# Altium footprint library Dip Switches.PcbLib: 39 footprints (part 3 of 3)
Each footprint in its own frame and in the unit in brackets; x right, y up, seen from the top. Pads: shape width x height; smd on the part's side, far side on the other; paste and mask are expansions set on the pad; w line width, h text height; cw(c..) or ccw(c..) is an arc to the next point about the centre after c.
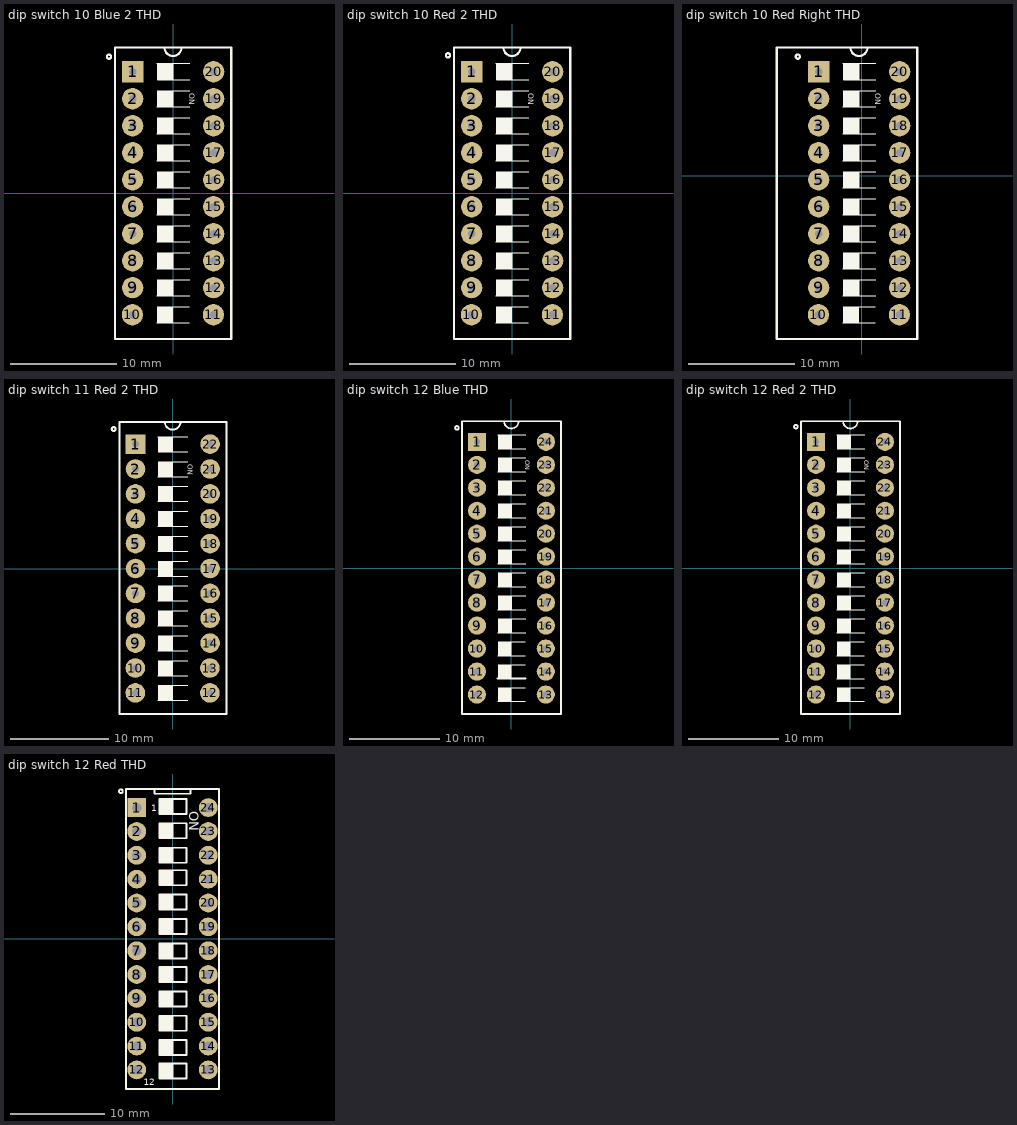
[diagram p2: the footprints below, top view; thin cyan lines are the x and y axes]

## dip switch 10 Blue 2 THD [mm]
height 6.5
pads (20):
  rect 2x2 hole 0.7: 1(-3.799,11.432)
  round 2 hole 0.7: 2(-3.799,8.892) 3(-3.799,6.352) 4(-3.799,3.812) 5(-3.799,1.272) 6(-3.799,-1.268) 7(-3.799,-3.808) 8(-3.799,-6.348) 9(-3.799,-8.888) 10(-3.821,-11.432) 11(3.799,-11.432) 12(3.821,-8.888) 13(3.821,-6.348) 14(3.821,-3.808) 15(3.821,-1.268) 16(3.821,1.272) 17(3.821,3.812) 18(3.821,6.352) 19(3.821,8.892) 20(3.821,11.432)
Top Overlay:
  circle w0.2: c-6.03,12.85 r0.2
  rectangle: -1.489,10.656 0.036,12.212
  rectangle: -1.489,8.106 0.036,9.662
  rectangle: -1.489,5.566 0.036,7.122
  rectangle: -1.489,3.026 0.036,4.582
  rectangle: -1.489,0.486 0.036,2.042
  rectangle: -1.489,-2.054 0.036,-0.498
  rectangle: -1.489,-4.594 0.036,-3.038
  rectangle: -1.489,-7.134 0.036,-5.578
  rectangle: -1.489,-9.674 0.036,-8.118
  rectangle: -1.511,-12.218 0.014,-10.662
  lines w0.1: -1.535,-12.202 1.539,-12.202 ; -1.513,-9.658 1.561,-9.658 ; -1.513,-7.118 1.561,-7.118 ; -1.513,-4.578 1.561,-4.578 ; -1.513,-2.038 1.561,-2.038 ; -1.513,0.502 1.561,0.502 ; -1.513,3.042 1.561,3.042 ; -1.513,5.582 1.561,5.582 ; -1.513,8.122 1.561,8.122 ; -1.513,12.212 1.561,12.212 ; -1.481,-10.672 1.539,-10.672 ; -1.459,-8.128 1.561,-8.128 ; -1.459,-5.588 1.561,-5.588 ; -1.459,-3.048 1.561,-3.048 ; -1.459,-0.508 1.561,-0.508 ; -1.459,2.032 1.561,2.032 ; -1.459,4.572 1.561,4.572 ; -1.459,7.112 1.561,7.112 ; -1.459,9.652 1.561,9.652 ; -1.459,10.672 1.561,10.672
  lines w0.2: -0.807,13.712 ccw(c-0.007,13.712) 0.793,13.712 ; -5.45,-13.714 -5.45,13.712 5.472,13.712 5.472,-13.714 -5.45,-13.714
  text "ON" at 1.535,9.4 h0.51
3D body "User Library-DIP SWITCH 10 POS CTS 206.step": height 8.25, standoff -3.5, extent -4.878,-13.861 4.902,13.719

## dip switch 10 Red 2 THD [mm]
height 6.5
pads (20):
  rect 2x2 hole 0.7: 1(-3.799,11.432)
  round 2 hole 0.7: 2(-3.799,8.892) 3(-3.799,6.352) 4(-3.799,3.812) 5(-3.799,1.272) 6(-3.799,-1.268) 7(-3.799,-3.808) 8(-3.799,-6.348) 9(-3.799,-8.888) 10(-3.821,-11.432) 11(3.799,-11.432) 12(3.821,-8.888) 13(3.821,-6.348) 14(3.821,-3.808) 15(3.821,-1.268) 16(3.821,1.272) 17(3.821,3.812) 18(3.821,6.352) 19(3.821,8.892) 20(3.821,11.432)
Top Overlay:
  circle w0.2: c-6.03,12.977 r0.2
  rectangle: -1.511,-12.218 0.014,-10.662
  rectangle: -1.489,-9.674 0.036,-8.118
  rectangle: -1.489,-7.134 0.036,-5.578
  rectangle: -1.489,-4.594 0.036,-3.038
  rectangle: -1.489,-2.054 0.036,-0.498
  rectangle: -1.489,0.486 0.036,2.042
  rectangle: -1.489,3.026 0.036,4.582
  rectangle: -1.489,5.566 0.036,7.122
  rectangle: -1.489,8.106 0.036,9.662
  rectangle: -1.489,10.656 0.036,12.212
  lines w0.1: -1.535,-12.202 1.539,-12.202 ; -1.513,-9.658 1.561,-9.658 ; -1.513,-7.118 1.561,-7.118 ; -1.513,-4.578 1.561,-4.578 ; -1.513,-2.038 1.561,-2.038 ; -1.513,0.502 1.561,0.502 ; -1.513,3.042 1.561,3.042 ; -1.513,5.582 1.561,5.582 ; -1.513,8.122 1.561,8.122 ; -1.513,12.212 1.561,12.212 ; -1.481,-10.672 1.539,-10.672 ; -1.459,-8.128 1.561,-8.128 ; -1.459,-5.588 1.561,-5.588 ; -1.459,-3.048 1.561,-3.048 ; -1.459,-0.508 1.561,-0.508 ; -1.459,2.032 1.561,2.032 ; -1.459,4.572 1.561,4.572 ; -1.459,7.112 1.561,7.112 ; -1.459,9.652 1.561,9.652 ; -1.459,10.672 1.561,10.672
  lines w0.2: -0.807,13.712 ccw(c-0.007,13.712) 0.793,13.712 ; -5.45,-13.714 5.472,-13.714 5.472,13.712 -5.45,13.712 -5.45,-13.714
  text "ON" at 1.535,9.4 h0.51
3D body "User Library-DS1040-10 (DIP_switch).step": height 6.8, standoff -3.85, extent -4.975,-13.441 4.925,13.419

## dip switch 10 Red Right THD [mm]
height 6.5
pads (20):
  rect 2x2 hole 0.7: 1(-4.053,9.781)
  round 2 hole 0.7: 2(-4.053,7.241) 3(-4.053,4.701) 4(-4.053,2.161) 5(-4.053,-0.379) 6(-4.053,-2.919) 7(-4.053,-5.459) 8(-4.053,-7.999) 9(-4.053,-10.539) 10(-4.075,-13.083) 11(3.545,-13.083) 12(3.567,-10.539) 13(3.567,-7.999) 14(3.567,-5.459) 15(3.567,-2.919) 16(3.567,-0.379) 17(3.567,2.161) 18(3.567,4.701) 19(3.567,7.241) 20(3.567,9.781)
Top Overlay:
  circle w0.2: c-6.02,11.201 r0.2
  rectangle: -1.743,-3.705 -0.218,-2.149
  rectangle: -1.743,-6.245 -0.218,-4.689
  rectangle: -1.743,9.005 -0.218,10.561
  rectangle: -1.743,6.455 -0.218,8.011
  rectangle: -1.743,3.915 -0.218,5.471
  rectangle: -1.743,1.375 -0.218,2.931
  rectangle: -1.743,-1.165 -0.218,0.391
  rectangle: -1.743,-8.785 -0.218,-7.229
  rectangle: -1.743,-11.325 -0.218,-9.769
  rectangle: -1.765,-13.869 -0.24,-12.313
  lines w0.1: -1.789,-13.853 1.285,-13.853 ; -1.767,-11.309 1.307,-11.309 ; -1.767,-8.769 1.307,-8.769 ; -1.767,-6.229 1.307,-6.229 ; -1.767,-3.689 1.307,-3.689 ; -1.767,-1.149 1.307,-1.149 ; -1.767,1.391 1.307,1.391 ; -1.767,3.931 1.307,3.931 ; -1.767,6.471 1.307,6.471 ; -1.767,10.561 1.307,10.561 ; -1.735,-12.323 1.285,-12.323 ; -1.713,-9.779 1.307,-9.779 ; -1.713,-7.239 1.307,-7.239 ; -1.713,-4.699 1.307,-4.699 ; -1.713,-2.159 1.307,-2.159 ; -1.713,0.381 1.307,0.381 ; -1.713,2.921 1.307,2.921 ; -1.713,5.461 1.307,5.461 ; -1.713,8.001 1.307,8.001 ; -1.713,9.021 1.307,9.021
  lines w0.2: -1.061,12.061 ccw(c-0.261,12.061) 0.539,12.061 ; -7.99,-15.365 -7.99,12.061 5.218,12.061 5.218,-15.365 -7.99,-15.365
  text "ON" at 1.281,7.749 h0.51
3D body "User Library-DIP-Switch-10P (1).step": height 9.5, standoff -3.5, extent -7.799,-15.129 4.701,11.831

## dip switch 11 Red 2 THD [mm]
height 6.5
pads (22):
  rect 2x2 hole 0.7: 1(-3.799,12.702)
  round 2 hole 0.7: 2(-3.799,10.162) 3(-3.799,7.622) 4(-3.799,5.082) 5(-3.799,2.542) 6(-3.799,0.002) 7(-3.799,-2.538) 8(-3.799,-5.078) 9(-3.799,-7.618) 10(-3.821,-10.162) 11(-3.821,-12.702) 12(3.799,-12.702) 13(3.799,-10.162) 14(3.821,-7.618) 15(3.821,-5.078) 16(3.821,-2.538) 17(3.821,0.002) 18(3.821,2.542) 19(3.821,5.082) 20(3.821,7.622) 21(3.821,10.162) 22(3.821,12.702)
Top Overlay:
  circle w0.2: c-6.03,14.247 r0.2
  rectangle: -1.511,-13.488 0.014,-11.932
  rectangle: -1.489,-0.784 0.036,0.772
  rectangle: -1.489,-3.324 0.036,-1.768
  rectangle: -1.489,11.926 0.036,13.482
  rectangle: -1.489,9.376 0.036,10.932
  rectangle: -1.489,6.836 0.036,8.392
  rectangle: -1.489,4.296 0.036,5.852
  rectangle: -1.489,1.756 0.036,3.312
  rectangle: -1.489,-5.864 0.036,-4.308
  rectangle: -1.489,-8.404 0.036,-6.848
  rectangle: -1.511,-10.948 0.014,-9.392
  lines w0.1: -1.535,-13.472 1.539,-13.472 ; -1.535,-10.932 1.539,-10.932 ; -1.513,-8.388 1.561,-8.388 ; -1.513,-5.848 1.561,-5.848 ; -1.513,-3.308 1.561,-3.308 ; -1.513,-0.768 1.561,-0.768 ; -1.513,1.772 1.561,1.772 ; -1.513,4.312 1.561,4.312 ; -1.513,6.852 1.561,6.852 ; -1.513,9.392 1.561,9.392 ; -1.513,13.482 1.561,13.482 ; -1.481,-11.942 1.539,-11.942 ; -1.481,-9.402 1.539,-9.402 ; -1.459,-6.858 1.561,-6.858 ; -1.459,-4.318 1.561,-4.318 ; -1.459,-1.778 1.561,-1.778 ; -1.459,0.762 1.561,0.762 ; -1.459,3.302 1.561,3.302 ; -1.459,5.842 1.561,5.842 ; -1.459,8.382 1.561,8.382 ; -1.459,10.922 1.561,10.922 ; -1.459,11.942 1.561,11.942
  lines w0.2: -0.807,14.982 ccw(c-0.007,14.982) 0.793,14.982 ; -5.45,-14.857 -5.45,14.982 5.472,14.982 5.472,-14.857 -5.45,-14.857
  text "ON" at 1.535,10.67 h0.51
3D body "User Library-DS1040-11 (DIP_switch).step": height 6.8, standoff -3.85, extent -4.937,-14.698 4.963,14.702

## dip switch 12 Blue THD [mm]
height 6.5
pads (24):
  rect 2x2 hole 0.7: 1(-3.799,13.972)
  round 2 hole 0.7: 2(-3.799,11.432) 3(-3.799,8.892) 4(-3.799,6.352) 5(-3.799,3.812) 6(-3.799,1.272) 7(-3.799,-1.268) 8(-3.799,-3.808) 9(-3.799,-6.348) 10(-3.821,-8.892) 11(-3.821,-11.432) 12(-3.821,-13.972) 13(3.799,-13.972) 14(3.799,-11.432) 15(3.799,-8.892) 16(3.821,-6.348) 17(3.821,-3.808) 18(3.821,-1.268) 19(3.821,1.272) 20(3.821,3.812) 21(3.821,6.352) 22(3.821,8.892) 23(3.821,11.432) 24(3.821,13.972)
Top Overlay:
  circle w0.2: c-6.03,15.517 r0.2
  rectangle: -1.511,-14.758 0.014,-13.202
  rectangle: -1.511,-9.678 0.014,-8.122
  rectangle: -1.489,-7.134 0.036,-5.578
  rectangle: -1.489,-4.594 0.036,-3.038
  rectangle: -1.489,3.026 0.036,4.582
  rectangle: -1.489,5.566 0.036,7.122
  rectangle: -1.489,8.106 0.036,9.662
  rectangle: -1.489,10.646 0.036,12.202
  rectangle: -1.489,13.196 0.036,14.752
  rectangle: -1.489,-2.054 0.036,-0.498
  rectangle: -1.489,0.486 0.036,2.042
  rectangle: -1.511,-12.218 0.014,-10.662
  lines w0.1: -1.535,-14.742 1.539,-14.742 ; -1.535,-9.662 1.539,-9.662 ; -1.513,-7.118 1.561,-7.118 ; -1.513,-4.578 1.561,-4.578 ; -1.513,-2.038 1.561,-2.038 ; -1.513,0.502 1.561,0.502 ; -1.513,3.042 1.561,3.042 ; -1.513,5.582 1.561,5.582 ; -1.513,8.122 1.561,8.122 ; -1.513,10.662 1.561,10.662 ; -1.513,14.752 1.561,14.752 ; -1.481,-13.212 1.539,-13.212 ; -1.481,-10.672 1.539,-10.672 ; -1.481,-8.132 1.539,-8.132 ; -1.459,-5.588 1.561,-5.588 ; -1.459,-3.048 1.561,-3.048 ; -1.459,-0.508 1.561,-0.508 ; -1.459,2.032 1.561,2.032 ; -1.459,4.572 1.561,4.572 ; -1.459,7.112 1.561,7.112 ; -1.459,9.652 1.561,9.652 ; -1.459,12.192 1.561,12.192 ; -1.459,13.212 1.561,13.212
  lines w0.2: -0.807,16.252 ccw(c-0.007,16.252) 0.793,16.252 ; -5.45,-16.127 5.472,-16.127 5.472,16.252 -5.45,16.252 -5.45,-16.127
  lines w0.25: -1.535,-12.202 1.539,-12.202
  text "ON" at 1.535,11.94 h0.51
3D body "User Library-DIP SWITCH 12 POS CTS 206.step": height 8.25, standoff -3.5, extent -4.625,-16.328 5.155,16.332

## dip switch 12 Red 2 THD [mm]
height 6.5
pads (24):
  rect 2x2 hole 0.7: 1(-3.799,13.972)
  round 2 hole 0.7: 2(-3.799,11.432) 3(-3.799,8.892) 4(-3.799,6.352) 5(-3.799,3.812) 6(-3.799,1.272) 7(-3.799,-1.268) 8(-3.799,-3.808) 9(-3.799,-6.348) 10(-3.821,-8.892) 11(-3.821,-11.432) 12(-3.821,-13.972) 13(3.799,-13.972) 14(3.799,-11.432) 15(3.799,-8.892) 16(3.821,-6.348) 17(3.821,-3.808) 18(3.821,-1.268) 19(3.821,1.272) 20(3.821,3.812) 21(3.821,6.352) 22(3.821,8.892) 23(3.821,11.432) 24(3.821,13.972)
Top Overlay:
  circle w0.2: c-6.03,15.644 r0.2
  rectangle: -1.511,-12.218 0.014,-10.662
  rectangle: -1.489,0.486 0.036,2.042
  rectangle: -1.489,-2.054 0.036,-0.498
  rectangle: -1.489,13.196 0.036,14.752
  rectangle: -1.489,10.646 0.036,12.202
  rectangle: -1.489,8.106 0.036,9.662
  rectangle: -1.489,5.566 0.036,7.122
  rectangle: -1.489,3.026 0.036,4.582
  rectangle: -1.489,-4.594 0.036,-3.038
  rectangle: -1.489,-7.134 0.036,-5.578
  rectangle: -1.511,-9.678 0.014,-8.122
  rectangle: -1.511,-14.758 0.014,-13.202
  lines w0.1: -1.535,-14.742 1.539,-14.742 ; -1.535,-12.202 1.539,-12.202 ; -1.535,-9.662 1.539,-9.662 ; -1.513,-7.118 1.561,-7.118 ; -1.513,-4.578 1.561,-4.578 ; -1.513,-2.038 1.561,-2.038 ; -1.513,0.502 1.561,0.502 ; -1.513,3.042 1.561,3.042 ; -1.513,5.582 1.561,5.582 ; -1.513,8.122 1.561,8.122 ; -1.513,10.662 1.561,10.662 ; -1.513,14.752 1.561,14.752 ; -1.481,-13.212 1.539,-13.212 ; -1.481,-10.672 1.539,-10.672 ; -1.481,-8.132 1.539,-8.132 ; -1.459,-5.588 1.561,-5.588 ; -1.459,-3.048 1.561,-3.048 ; -1.459,-0.508 1.561,-0.508 ; -1.459,2.032 1.561,2.032 ; -1.459,4.572 1.561,4.572 ; -1.459,7.112 1.561,7.112 ; -1.459,9.652 1.561,9.652 ; -1.459,12.192 1.561,12.192 ; -1.459,13.212 1.561,13.212
  lines w0.2: -0.807,16.252 ccw(c-0.007,16.252) 0.793,16.252 ; -5.45,-16.127 -5.45,16.252 5.472,16.252 5.472,-16.127 -5.45,-16.127
  text "ON" at 1.535,11.94 h0.51
3D body "User Library-DS1040-12 (DIP_switch).step": height 6.8, standoff -3.85, extent -4.939,-15.968 4.961,15.972

## dip switch 12 Red THD [mm] "SWITCH DIP 12POS, THD, 2.54mm"
pads (24):
  rect 2x2 hole 1: 1(-3.81,13.97)
  round 2 hole 1: 2(-3.81,11.43) 3(-3.81,8.89) 4(-3.81,6.35) 5(-3.81,3.81) 6(-3.81,1.27) 7(-3.81,-1.27) 8(-3.81,-3.81) 9(-3.81,-6.35) 10(-3.81,-8.89) 11(-3.81,-11.43) 12(-3.81,-13.97) 13(3.81,-13.97) 14(3.81,-11.43) 15(3.81,-8.89) 16(3.81,-6.35) 17(3.81,-3.81) 18(3.81,-1.27) 19(3.81,1.27) 20(3.81,3.81) 21(3.81,6.35) 22(3.81,8.89) 23(3.81,11.43) 24(3.81,13.97)
Top Overlay:
  circle w0.2: c-5.5,15.71 r0.2
  rectangle: -1.4,13.3 0.1,14.9
  rectangle: -1.4,10.7 0.1,12.3
  rectangle: -1.4,8.1 0.1,9.7
  rectangle: -1.4,5.7 0.1,7.3
  rectangle: -1.4,3.1 0.1,4.7
  rectangle: -1.4,0.5 0.1,2.1
  rectangle: -1.4,-2.1 0.1,-0.5
  rectangle: -1.4,-4.6 0.1,-3
  rectangle: -1.4,-14.9 0.1,-13.3
  rectangle: -1.4,-12.4 0.1,-10.8
  rectangle: -1.4,-9.8 0.1,-8.2
  rectangle: -1.4,-7.2 0.1,-5.6
  lines w0.2: -1.91,15.951 -1.91,15.443 1.9,15.443 1.9,15.951 ; -4.953,-16.002 4.953,-16.002 4.953,15.951 -4.953,15.951 -4.953,-16.002 ; -1.4,-14.9 1.5,-14.9 1.5,-13.3 -1.4,-13.3 -1.4,-14.9 ; -1.4,-12.4 1.5,-12.4 1.5,-10.8 -1.4,-10.8 -1.4,-12.4 ; -1.4,-9.8 1.5,-9.8 1.5,-8.2 -1.4,-8.2 -1.4,-9.8 ; -1.4,-7.2 1.5,-7.2 1.5,-5.6 -1.4,-5.6 -1.4,-7.2 ; -1.4,-4.6 -1.4,-3 1.5,-3 1.5,-4.6 -1.4,-4.6 ; -1.4,-2.1 -1.4,-0.5 1.5,-0.5 1.5,-2.1 -1.4,-2.1 ; -1.4,0.5 -1.4,2.1 1.5,2.1 1.5,0.5 -1.4,0.5 ; -1.4,3.1 -1.4,4.7 1.5,4.7 1.5,3.1 -1.4,3.1 ; -1.4,5.7 -1.4,7.3 1.5,7.3 1.5,5.7 -1.4,5.7 ; -1.4,8.1 -1.4,9.7 1.5,9.7 1.5,8.1 -1.4,8.1 ; -1.4,10.7 -1.4,12.3 1.5,12.3 1.5,10.7 -1.4,10.7 ; -1.4,13.3 -1.4,14.9 1.5,14.9 1.5,13.3 -1.4,13.3
  text "1" at -2.286,13.589 h0.7
  text "12" at -3.048,-15.621 h0.7
  text "ON" at 1.8,13.6 h1
3D body: height 5.59, standoff 0, extent -1.448,-13.208 1.443,-12.192
3D body: height 5.08, standoff 0.25, extent -0.737,-14.732 1.443,-13.208
3D body: height 6.35, standoff 0.25, extent -1.448,-14.732 -0.737,-13.208
3D body: height 5.59, standoff 0, extent -1.448,-10.668 1.443,-9.652
3D body: height 5.08, standoff 0.25, extent -0.737,-12.192 1.443,-10.668
3D body: height 6.35, standoff 0.25, extent -1.448,-12.192 -0.737,-10.668
3D body: height 5.59, standoff 0, extent -1.448,-8.128 1.443,-7.112
3D body: height 5.08, standoff 0.25, extent -0.737,-9.652 1.443,-8.128
3D body: height 6.35, standoff 0.25, extent -1.448,-9.652 -0.737,-8.128
3D body: height 5.59, standoff 0, extent -1.448,-5.588 1.443,-4.572
3D body: height 5.08, standoff 0.25, extent -0.737,-7.112 1.443,-5.588
3D body: height 6.35, standoff 0.25, extent -1.448,-7.112 -0.737,-5.588
3D body: height 5.59, standoff 0, extent -1.448,-3.048 1.443,-2.032
3D body: height 5.08, standoff 0.25, extent -0.737,-4.572 1.443,-3.048
3D body: height 6.35, standoff 0.25, extent -1.448,-4.572 -0.737,-3.048
3D body: height 5.59, standoff 0, extent -1.448,-0.508 1.443,0.508
3D body: height 5.08, standoff 0.25, extent -0.737,-2.032 1.443,-0.508
3D body: height 6.35, standoff 0.25, extent -1.448,-2.032 -0.737,-0.508
3D body: height 5.59, standoff 0, extent -1.448,2.032 1.443,3.048
3D body: height 5.08, standoff 0.25, extent -0.737,0.508 1.443,2.032
3D body: height 6.35, standoff 0.25, extent -1.448,0.508 -0.737,2.032
3D body: height 5.59, standoff 0, extent -1.448,4.572 1.443,5.588
3D body: height 5.08, standoff 0.25, extent -0.737,3.048 1.443,4.572
3D body: height 6.35, standoff 0.25, extent -1.448,3.048 -0.737,4.572
3D body: height 6.35, standoff 0.25, extent -1.448,10.668 -0.737,12.192
3D body: height 5.08, standoff 0.25, extent -0.737,10.668 1.443,12.192
3D body: height 5.59, standoff 0, extent -1.448,9.652 1.443,10.668
3D body: height 5.59, standoff 0, extent -1.448,7.112 1.443,8.128
3D body: height 5.59, standoff 0, extent -1.448,12.192 1.443,13.208
3D body: height 6.35, standoff 0.25, extent -1.448,5.588 -0.737,7.112
3D body: height 5.08, standoff 0.25, extent -0.737,5.588 1.443,7.112
3D body: height 6.35, standoff 0.25, extent -1.448,8.128 -0.737,9.652
3D body: height 5.08, standoff 0.25, extent -0.737,8.128 1.443,9.652
3D body: height 5.08, standoff 0.25, extent -0.737,13.208 1.443,14.732
3D body: height 6.35, standoff 0.25, extent -1.448,13.208 -0.737,14.732
3D body: height 5.59, standoff 0.25, extent 2.205,11.605 3.757,13.171
3D body: height 5.59, standoff 0.03, extent 2.28,13.716 3.697,14.524
3D body: height 5.59, standoff 0.25, extent 2.195,13.308 3.769,14.926
3D body: height 5.59, standoff 0, extent -1.448,14.732 1.443,15.443
3D body: height 0.25, standoff 0.05, extent -4.953,-15.976 4.953,15.976
3D body: height 5.59, standoff 0, extent -4.953,-16.002 4.953,15.951
3D body: height 3.81, standoff 0, extent -1.91,15.443 1.9,15.951
3D body: height 0.76, standoff 0, extent -4.063,6.097 -3.557,6.603
3D body: height 0.76, standoff 0, extent -4.063,8.637 -3.557,9.143
3D body: height 0.76, standoff 0, extent -4.073,11.177 -3.567,11.683
3D body: height 0.76, standoff 0, extent -4.063,13.717 -3.557,14.223
3D body: height 0.76, standoff 0, extent 3.557,6.097 4.063,6.603
3D body: height 0.76, standoff 0, extent 3.557,8.637 4.063,9.143
3D body: height 0.76, standoff 0, extent 3.557,11.177 4.063,11.683
3D body: height 0.76, standoff 0, extent 3.557,13.717 4.063,14.223
3D body: height 0.76, standoff 0, extent 3.557,-1.523 4.063,-1.017
3D body: height 0.76, standoff 0, extent 3.557,-4.063 4.063,-3.557
3D body: height 0.76, standoff 0, extent 3.557,1.017 4.063,1.523
3D body: height 0.76, standoff 0, extent -4.063,3.557 -3.557,4.063
3D body: height 0.76, standoff 0, extent -4.063,1.017 -3.557,1.523
3D body: height 0.76, standoff 0, extent -4.063,-1.523 -3.557,-1.017
3D body: height 0.76, standoff 0, extent -4.063,-4.063 -3.557,-3.557
3D body: height 0.76, standoff 0, extent -4.063,-6.603 -3.557,-6.097
3D body: height 0.76, standoff 0, extent -4.063,-9.143 -3.557,-8.637
3D body: height 0.76, standoff 0, extent -4.063,-11.683 -3.557,-11.177
3D body: height 0.76, standoff 0, extent -4.063,-14.223 -3.557,-13.717
3D body: height 0.76, standoff 0, extent 3.557,-14.223 4.063,-13.717
3D body: height 0.76, standoff 0, extent 3.557,-11.683 4.063,-11.177
3D body: height 0.76, standoff 0, extent 3.557,-9.143 4.063,-8.637
3D body: height 0.76, standoff 0, extent 3.557,-6.603 4.063,-6.097